# Altium footprint library Mine.PcbLib: 306 footprints (part 20 of 20)
Each footprint in its own frame and in the unit in brackets; x right, y up, seen from the top. Pads: shape width x height; smd on the part's side, far side on the other; paste and mask are expansions set on the pad; w line width, h text height; cw(c..) or ccw(c..) is an arc to the next point about the centre after c.
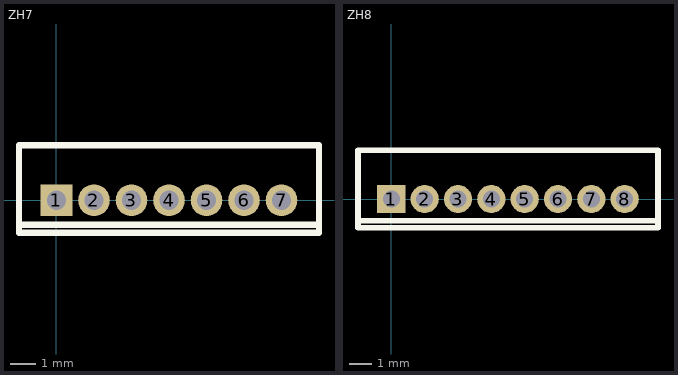
[diagram p19: the footprints below, top view; thin cyan lines are the x and y axes]

## ZH7 [mil] "Miniature"
height 177.17
pads (7):
  rect 50x50 hole 30: 1(0,0)
  round 50 hole 30: 2(59.06,0) 3(118.11,0) 4(177.17,0) 5(236.22,0) 6(295.28,0) 7(354.33,0)
Top Overlay:
  lines w10: -59.06,-38.39 412.4,-38.39 ; -59.06,86.61 -59.06,-51.18 413.39,-51.18 413.39,86.61 -58.07,86.61

## ZH8 [mil] "Miniature"
height 177.17
pads (8):
  rect 50x50 hole 30: 1(0,0)
  round 50 hole 30: 2(59.06,0) 3(118.11,0) 4(177.17,0) 5(236.22,0) 6(295.28,0) 7(354.33,0) 8(413.39,0)
Top Overlay:
  lines w10: -59.06,-38.39 472.44,-38.39 ; -59.06,86.61 -59.06,-51.18 472.44,-51.18 472.44,86.61 -58.07,86.61